# Altium footprint library GamePI PCB LIB.PcbLib: 24 footprints (part 2 of 2)
Each footprint in its own frame and in the unit in brackets; x right, y up, seen from the top. Pads: shape width x height; smd on the part's side, far side on the other; paste and mask are expansions set on the pad; w line width, h text height; cw(c..) or ccw(c..) is an arc to the next point about the centre after c.
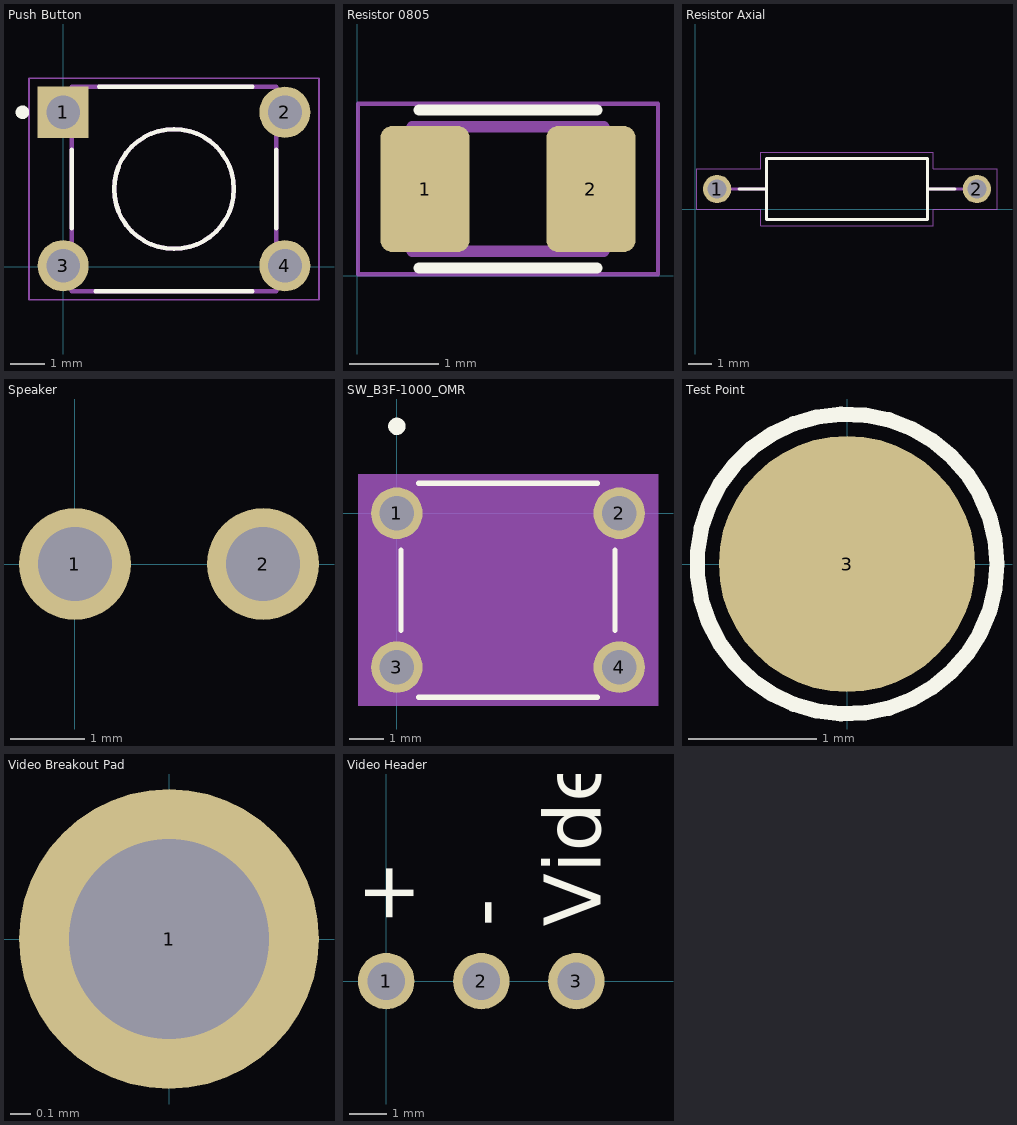
[diagram p1: the footprints below, top view; thin cyan lines are the x and y axes]

## Push Button [mm]
pads (4):
  rect 1.498x1.498 / inner round 1.498 / far side rect 1.498x1.498 hole 0.99: 1(0,4.525)
  round 1.498 hole 0.99: 2(6.5,4.525) 3(0,0.025) 4(6.5,0.025)
Top Overlay:
  circle w0.127: c3.25,2.275 r1.755
  circle w0.2: c-1.195,4.525 r0.1
  lines w0.127: 0.255,1.125 0.255,3.425 ; 0.95,-0.72 5.55,-0.72 ; 1.05,5.27 5.55,5.27 ; 6.25,1.125 6.25,3.425
Mechanical 13:
  circle w0.127: c3.25,2.275 r1.755
  lines w0.127: 0.255,-0.72 0.255,5.27 6.245,5.27 6.245,-0.72 0.255,-0.72
Mechanical 15:
  lines w0.05: -1,-0.975 -1,5.525 7.5,5.525 7.5,-0.975 -1,-0.975
3D body "1825910-6--3DModel-STEP-1 v1.step": height 4.41, standoff -4.01, extent -0.673,-0.745 7.123,5.245

## Resistor 0805 [mm]
pads (2):
  rrect25% 1x1.42 smd: 1(0.765,0.975) 2(2.635,0.975)
Top Overlay:
  lines w0.127: 0.7,0.085 2.7,0.085 ; 0.7,1.865 2.7,1.865
Mechanical 13:
  lines w0.127: 0.62,0.275 2.78,0.275 2.78,1.675 0.62,1.675 0.62,0.275
Mechanical 15:
  lines w0.05: 0.01,0.015 3.39,0.015 3.39,1.935 0.01,1.935 0.01,0.015
3D body "step_temp.STEP": height 0.6, standoff 0, extent 0.7,0.35 2.7,1.6

## Resistor Axial [mm]
pads (2):
  round 1.2 hole 0.8: 1(0.929,0.865) 2(11.929,0.865)
Top Overlay:
  lines w0.127: 1.849,0.865 3.029,0.865 ; 11.009,0.865 9.829,0.865 ; 3.029,0.865 3.029,2.165 9.829,2.165 9.829,0.865 ; 3.029,0.865 3.029,-0.435 9.829,-0.435 9.829,0.865
Mechanical 13:
  lines w0.127: 1.529,0.865 3.029,0.865 ; 11.329,0.865 9.829,0.865 ; 3.029,0.865 3.029,2.165 9.829,2.165 9.829,0.865 ; 3.029,0.865 3.029,-0.435 9.829,-0.435 9.829,0.865
Mechanical 15:
  lines w0.05: 0.079,0.015 2.779,0.015 2.779,-0.685 10.079,-0.685 10.079,0.015 12.779,0.015 12.779,1.715 10.079,1.715 10.079,2.415 2.779,2.415 2.779,1.715 0.079,1.715 0.079,0.015
3D body "step_temp.STEP": height 2.6, standoff -25.53, extent 0.654,-0.435 12.204,2.165

## Speaker [mm]
pads (2):
  round 1.508 hole 1: 1(0,0) 2(2.54,0)

## SW_B3F-1000_OMR [mm]
pads (4):
  round 1.508 hole 1 mask+0: 1(0,0) 2(6.5,0) 3(0,-4.5) 4(6.5,-4.5)
Top Overlay:
  circle w0.254: c0,2.54 r0.127
  lines w0.152: 0.123,-3.42 0.123,-1.08 ; 0.642,-5.377 5.858,-5.377 ; 0.642,0.877 5.858,0.877 ; 6.377,-3.42 6.377,-1.08
Bottom Overlay:
  circle w0.254: c0,2.54 r0.127
Mechanical 5:
  region: -1.135,1.135 7.635,1.135 7.635,-5.635 -1.135,-5.635
Mechanical 13:
  circle w0.254: c1.27,0 r0.127
  circle w0: c3.25,-2.25 r1.75
  lines w0.025: -0.5,-5 -0.5,-4 0.25,-4 0.25,-5 -0.5,-5 ; -0.5,-0.5 -0.5,0.5 0.25,0.5 0.25,-0.5 -0.5,-0.5 ; 0.25,-5.25 6.25,-5.25 6.25,0.75 0.25,0.75 0.25,-5.25 ; 6.25,-5 6.25,-4 7,-4 7,-5 6.25,-5 ; 6.25,-0.5 6.25,0.5 7,0.5 7,-0.5 6.25,-0.5
Mechanical 15:
  region: -0.004,-5.508 -1.008,-5.508 -1.008,1.008 -0.004,1.008 -0.004,1.004 6.504,1.004 6.504,1.008 7.508,1.008 7.508,-5.508 6.504,-5.508 6.504,-5.504 -0.004,-5.504
  lines w0.152: -1.008,-5.508 -1.008,1.008 -0.004,1.008 -0.004,1.004 6.504,1.004 6.504,1.008 7.508,1.008 7.508,-5.508 6.504,-5.508 6.504,-5.504 -0.004,-5.504 -0.004,-5.508 -1.008,-5.508
3D body: height 0.25, standoff 0, extent 0,0 0.254,0.254

## Test Point [mm]
pads (1):
  round 2 smd paste-1: 3(0,0)
Top Overlay:
  circle w0.12: c0,0 r1.17
3D body: height 0.03, standoff 0, extent -1,-1 1,1

## Video Breakout Pad [mm]
pads (1):
  round 1.5 hole 1: 1(0,0)

## Video Header [mm]
pads (3):
  round 1.508 hole 1: 1(0,0) 2(2.54,0) 3(5.08,0)
Top Overlay:
  text "+" at 0.74,1.479 h1.52
  text "-" at 3.298,1.454 h1.52
  text "Video" at 5.736,1.454 h1.52